# Altium integrated library shared_lib_1.IntLib: 112 symbols
Pins are listed as number, name and electrical type; pins without a type are passive.

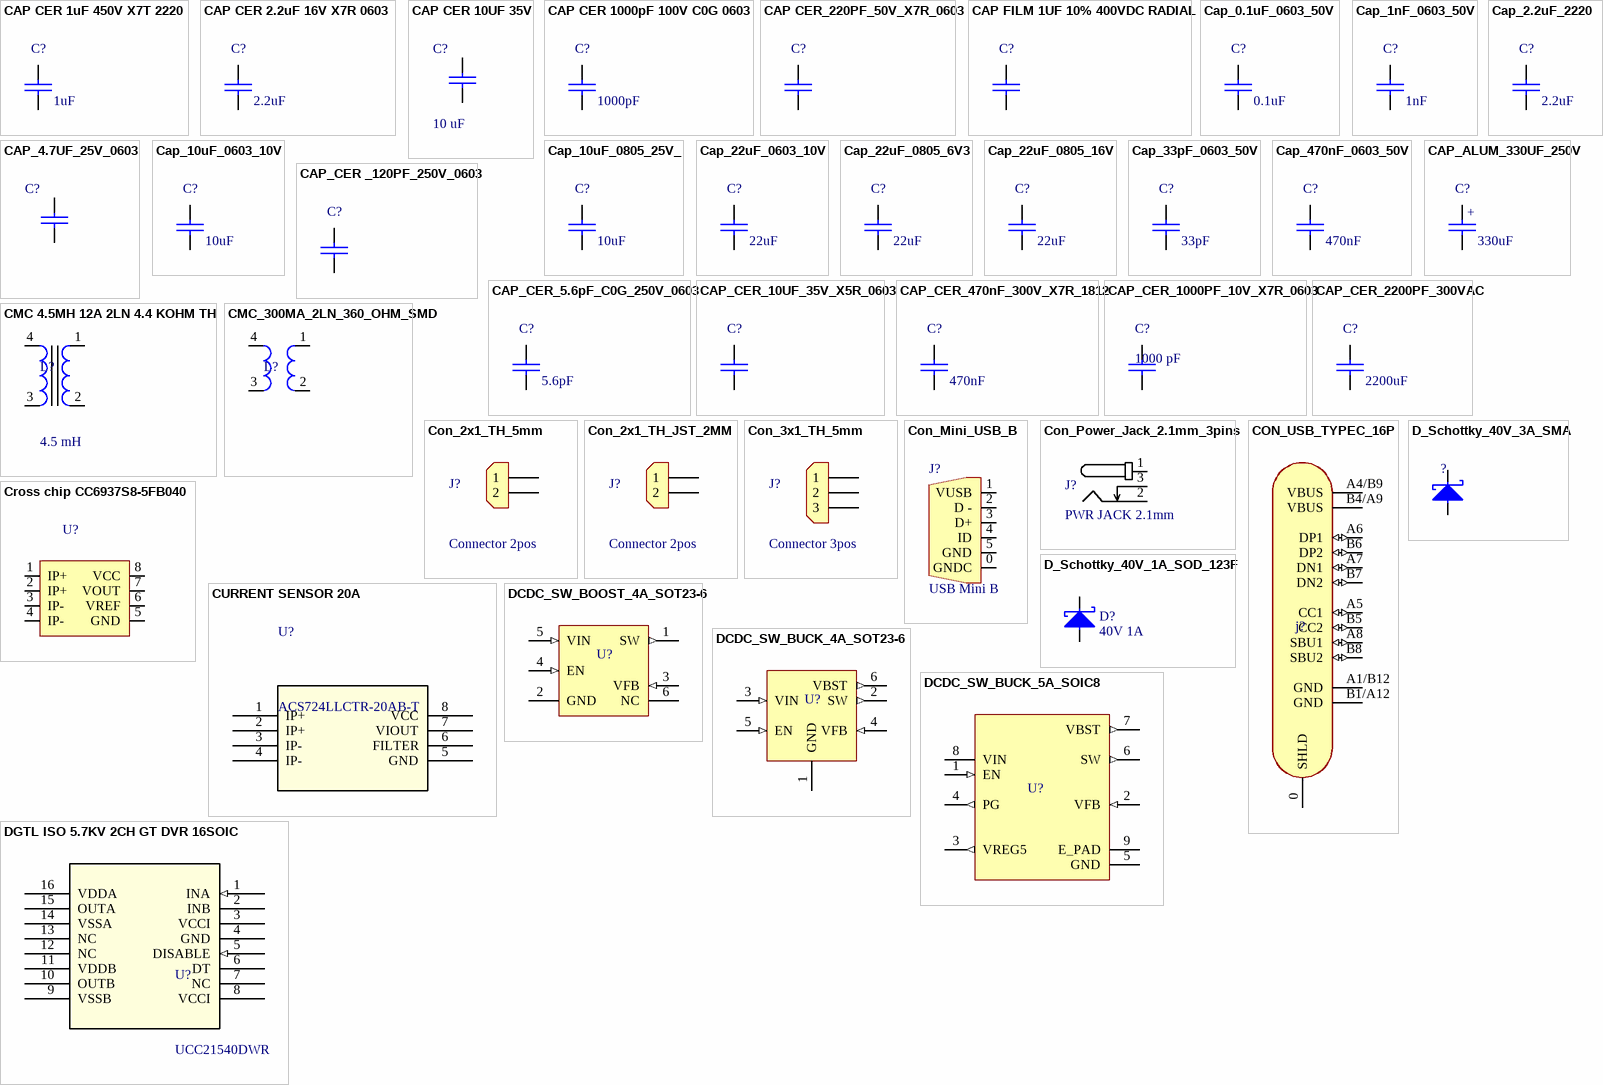
[diagram p0: symbols CAP CER 1uF 450V X7T 2220 to DGTL ISO 5.7KV 2CH GT DVR 16SOIC]

## CAP CER 1uF 450V X7T 2220
designator C?, comment value 1uF  (hidden comment: 1uF 50V)
CAP CER 1uF 450V X7T 2220; Manufacturer: muRata; Manufacturer Part Number: GC355XD7LP105KX17L; Supplier 1: LCSC; Supplier Part Number 1: C5119323; ComponentLink1Description: LCSC; ComponentLink1URL: https://www.lcsc.com/product-detail/C5119323.html?s_z=n_q_t_ceramic%2520capacitor&spm=wm.fly.bg.0.xh___wm.ssy.tc.0.tz&lcsc_vid=Q1QLUFRRTgRfUVdSQAVWUgVQT1JdUlwFE1MMV1EEQgAxVlNRTlhcUlRSQVJdUzsOAxUeFF5JWBYZEEoKFBINSQcJGk4dAgUUFAk%3D
footprint CAP_2220
pins: 1, 2

## CAP CER 2.2uF 16V X7R 0603
designator C?, comment value 2.2uF  (hidden comment: 2.2uF 16V)
CAP CER 2.2uF 16V X7R 0603; Manufacturer: Taiyo Yuden; Manufacturer Part Number: EMK107BB7225KA-T; Supplier 1: LCSC; Supplier Part Number 1: C337443; ComponentLink1Description: LCSC; ComponentLink1URL: https://www.lcsc.com/product-detail/C337443.html?s_z=n_q_EMK107BB7225KA-T&spm=wm.fly.bg.0.xh&lcsc_vid=FQVeX1BfQFIKVFVWE1NbBlcHQlcKVgFUQwMPAQZWElcxVlNRTlheVFNUQFFcXzsOAxUeFF5JWBYZEEoKFBINSQcJGk4eFQsCAgIaSgADAwAHC0slRldcVVFRWQkaCgg%3D
footprint 0603_cap
pins: 1, 2

## CAP CER 10UF 35V
designator C?, comment 10 uF
CAP CER 10UF 35V X5R 0603; Manufacturer: Murata Electronics; Manufacturer Part Number: GRM188R6YA106MA73J; ComponentLink1Description: LCSC; ComponentLink1URL: https://www.lcsc.com/product-detail/C2244191.html?s_z=n_q_GRM188R6YA106MA73J&spm=wm.fly.bg.0.xh&lcsc_vid=RQNdVwAEE1JbUldTTgAIXlFWQ1NYXlYETgNXUlBVFQMxVlNRTlReVF1VQ1JXXjsOAxUeFF5JWBYZEEoKFBINSQcJGk4eFQsCAgIaSgADAwAHC0slRVBWVFZVR08GEwkK; Supplier 1: LCSC; Supplier Part Number 1: C2244191
footprint 0603_cap
pins: 1, 2

## CAP CER 1000pF 100V C0G 0603
designator C?, comment 1000pF
CAP CER 1nF 100V C0G 0603; Manufacturer: muRata; Manufacturer Part Number: GRM1885C2A102JA01D; Supplier 1: LCSC; Supplier Part Number 1: C162257; ComponentLink1Description: LCSC; ComponentLink1URL: https://www.lcsc.com/product-detail/C162257.html?s_z=n_q_GRM1885C2A102JA01D&spm=wm.fly.bg.0.xh&lcsc_vid=FQVeX1BfQFIKVFVWE1NbBlcHQlcKVgFUQwMPAQZWElcxVlNRTlheVFZSTlJfXjsOAxUeFF5JWBYZEEoKFBINSQcJGk4%3D; Value: 1000pF
footprint 0603_cap
pins: 1, 2

## CAP CER_220PF_50V_X7R_0603
designator C?, comment 220 pF  (value not drawn)
CAP CER 220pF 50V X7R 0603; Manufacturer: Samsung Electro-Mechanics; Manufacturer Part Number: CL10B221KB8NNNC; Supplier 1: LCSC; Supplier Part Number 1: C1603; ComponentLink1Description: LCSC; ComponentLink1URL: https://www.lcsc.com/product-detail/C1603.html?spm=wm.fly.bg.0.xh&lcsc_vid=Q1QLUFRRTgRfUVdSQAVWUgVQT1JdUlwFE1MMV1EEQgAxVlNRTlhfUFFeRFBfXjsOAxUeFF5JWBYZEEoKFBINSQcJGk4NBhADEA4cHktXRlVcSQwSGg0%3D
footprint 0603_cap
pins: 1, 2

## CAP FILM 1UF 10% 400VDC RADIAL
designator C?, comment 1 uF  (value not drawn)
1 µF Film Capacitor 200V 400V Polyester, Polyethylene Terephthalate (PET), Metallized Radial; Manufacturer: KEMET; Manufacturer Part Number: R60MN4100AA40K; Supplier 1: LCSC; Supplier Part Number 1: C3775208; ComponentLink1Description: LCSC; ComponentLink1URL: https://www.lcsc.com/product-detail/C3775208.html?s_z=n_q_R60MN4100AA40K&spm=wm.fly.bg.0.xh&lcsc_vid=Q1QLUFRRTgRfUVdSQAVWUgVQT1JdUlwFE1MMV1EEQgAxVlNRTlZbUlJXT1VWXjsOAxUeFF5JWBYZEEoKFBINSQcJGk4eFQsCAgIaSgADAwAHC0slRVhXUFVQR08GEwkK
footprint CAP_M26.5X8.5_22.5_1_KEM
pins: 1, 2

## Cap_0.1uF_0603_50V
designator C?, comment 0.1uF
CAP CER 100nF 50V Y5V 0603; Manufacturer: FOJAN; Manufacturer Part Number: FCC0603F104Z500CT; Supplier 1: LCSC; Supplier Part Number 1: C5137469; ComponentLink1Description: LCSC; ComponentLink1URL: https://www.lcsc.com/product-detail/C5137469.html?s_z=n_q_0603F104Z500CT&spm=wm.fly.bg.2.xh&lcsc_vid=Q1QLUFRRTgRfUVdSQAVWUgVQT1JdUlwFE1MMV1EEQgAxVlNRTlhfUFBXRlRXUTsOAxUeFF5JWBYZEEoKFBINSQcJGk4eFQsCAgIaSgADAwAHC0slTldfUldfWQkaCgg%3D; Value: 0.1uF
footprint 0603_cap
pins: 1, 2

## Cap_1nF_0603_50V
designator C?, comment value 1nF  (hidden comment: 1nF 50V)
50V 1nF X7R ±10% 0603 Multilayer Ceramic Capacitors MLCC - SMD/SMT ROHS; Manufacturer: YAGEO; Manufacturer Part Number: CC0603KRX7R9BB102; Supplier 1: LCSC; Supplier Part Number 1: C100040; ComponentLink1Description: LCSC; ComponentLink1URL: https://www.lcsc.com/product-detail/Multilayer-Ceramic-Capacitors-MLCC-SMD-SMT_YAGEO-CC0603KRX7R9BB102_C100040.html
footprint 0603_cap
pins: 1, 2

## Cap_2.2uF_2220
designator C?, comment value 2.2uF  (hidden comment: 2.2uF 250V)
CAP CER 2.2uF 250V X7R 2220; Manufacturer: CCTC; Manufacturer Part Number: 2220B225K251CT; Supplier 1: LCSC; Supplier Part Number 1: C3845592; ComponentLink1Description: LCSC; ComponentLink1URL: https://www.lcsc.com/product-detail/Multilayer-Ceramic-Capacitors-MLCC-SMD-SMT_CCTC-TCC0603X5R106K100CT_C380314.html
footprint CAP_2220
pins: 1, 2

## CAP_4.7UF_25V_0603
designator C?
CAP CER 4.7uF 25V X5R 0603; Manufacturer: muRata; Manufacturer Part Number: GRM188R61E475KE11D; ComponentLink1Description: LCSC; ComponentLink1URL: https://www.lcsc.com/product-detail/C90057.html?s_z=n_q_GRM188R61E475KE11D&spm=wm.fly.bg.0.stp&lcsc_vid=RQNdVwAEE1JbUldTTgAIXlFWQ1NYXlYETgNXUlBVFQMxVlNRTlVXX11TRlZZXjsOAxUeFF5JWBYZEEoKFBINSQcJGk4%3D; Supplier 1: LCSC; Supplier Part Number 1: C90057
footprint 0603_cap
pins: 1, 2

## Cap_10uF_0603_10V
designator C?, comment value 10uF  (hidden comment: 10uF 10V)
10V 10uF X5R ±10% 0603 Multilayer Ceramic Capacitors MLCC - SMD/SMT ROHS; Manufacturer: CCTC; Manufacturer Part Number: TCC0603X5R106K100CT; Supplier 1: LCSC; Supplier Part Number 1: C380314; ComponentLink1Description: LCSC; ComponentLink1URL: https://www.lcsc.com/product-detail/Multilayer-Ceramic-Capacitors-MLCC-SMD-SMT_CCTC-TCC0603X5R106K100CT_C380314.html
footprint 0603_cap
pins: 1, 2

## Cap_10uF_0805_25V_
designator C?, comment value 10uF  (hidden comment: 10uF 25V)
25V 10uF X5R ±10% 0805 Multilayer Ceramic Capacitors MLCC - SMD/SMT ROHS; Manufacturer: Samsung Electro-Mechanics; Manufacturer Part Number: CL21A106KAYNNNE; Supplier 1: LCSC; Supplier Part Number 1: C15850; ComponentLink1Description: LCSC; ComponentLink1URL: https://lcsc.com/product-detail/Multilayer-Ceramic-Capacitors-MLCC-SMD-SMT_Samsung-Electro-Mechanics-CL21A106KAYNNNE_C15850.html
footprint 0805_cap
pins: 1, 2

## Cap_22uF_0603_10V
designator C?, comment value 22uF  (hidden comment: 22uF 10V)
10V 22uF X5R ±20% 0603 Multilayer Ceramic Capacitors MLCC - SMD/SMT ROHS; Manufacturer: HRE; Manufacturer Part Number: CGA0603X5R226M100JT; Supplier 1: LCSC; Supplier Part Number 1: C6119863; ComponentLink1Description: LCSC; ComponentLink1URL: https://lcsc.com/product-detail/Multilayer-Ceramic-Capacitors-MLCC-SMD-SMT_HRE-CGA0603X5R226M100JT_C6119863.html
footprint 0603_cap
pins: 1, 2

## Cap_22uF_0805_6V3
designator C?, comment value 22uF  (hidden comment: 22uF 6V3)
6.3V 22uF X5R ±20% 0805 Multilayer Ceramic Capacitors MLCC - SMD/SMT ROHS; Manufacturer: Samsung Electro-Mechanics; Manufacturer Part Number: CL21A226MQQNNNE; Supplier 1: LCSC; Supplier Part Number 1: C5674; ComponentLink1Description: LCSC; ComponentLink1URL: https://www.lcsc.com/product-detail/Multilayer-Ceramic-Capacitors-MLCC-SMD-SMT_Samsung-Electro-Mechanics-CL21A226MQQNNNE_C5674.html
footprint 0805_cap
pins: 1, 2

## Cap_22uF_0805_16V
designator C?, comment value 22uF  (hidden comment: 22uF 16V)
16V 22uF X5R ±20% 0805 Multilayer Ceramic Capacitors MLCC - SMD/SMT ROHS; Manufacturer: Chinocera; Manufacturer Part Number: HGC0805R5226M160NSLJ; Supplier 1: LCSC; Supplier Part Number 1: C33546008; ComponentLink1Description: LCSC; ComponentLink1URL: https://lcsc.com/product-detail/Multilayer-Ceramic-Capacitors-MLCC-SMD-SMT_Chinocera-HGC0805R5226M160NSLJ_C33546008.html
footprint 0805_cap
pins: 1, 2

## Cap_33pF_0603_50V
designator C?, comment value 33pF  (hidden comment: 33pF 50V)
50V 33pF NP0 ±5% 0603 Multilayer Ceramic Capacitors MLCC - SMD/SMT ROHS; Manufacturer: YAGEO; Manufacturer Part Number: CC0603JRNPO9BN330; Supplier 1: LCSC; Supplier Part Number 1: C107047; ComponentLink1Description: LCSC; ComponentLink1URL: https://www.lcsc.com/product-detail/Multilayer-Ceramic-Capacitors-MLCC-SMD-SMT_YAGEO-CC0603JRNPO9BN330_C107047.html
footprint 0603_cap
pins: 1, 2

## Cap_470nF_0603_50V
designator C?, comment value 470nF  (hidden comment: 470nF 50V)
50V 470nF X7R ±10% 0603 Multilayer Ceramic Capacitors MLCC - SMD/SMT ROHS; Manufacturer: Chinocera; Manufacturer Part Number: HGC0603R7474K500NTHJ; Supplier 1: LCSC; Supplier Part Number 1: C33546006; ComponentLink1Description: LCSC; ComponentLink1URL: https://lcsc.com/product-detail/Multilayer-Ceramic-Capacitors-MLCC-SMD-SMT_Chinocera-HGC0603R7474K500NTHJ_C33546006.html
footprint 0603_cap
pins: 1, 2

## CAP_ALUM_330UF_250V
designator C?, comment value 330uF  (hidden comment: 330 uF)
330 µF 250 V Aluminum Electrolytic Capacitors Radial, Can - Snap-In 3000 Hrs @ 105°C; Manufacturer: Rubycon; Manufacturer Part Number: 250MXG330MEFCSN22X30; Supplier 1: LCSC; Supplier Part Number 1: C239294; ComponentLink1Description: LCSC; ComponentLink1URL: https://www.lcsc.com/product-detail/C239294.html?s_z=n_q_250MXG330MEFCSN22X30
footprint CAP_MXC_22x30_RUB
pins: 1, 2
text: +

## CAP_CER _120PF_250V_0603
designator C?, comment 120 pF  (value not drawn)
120 pF ±5% 250V Capacitores cerámicos C0G, NP0 0603 (1608 métrico); Manufacturer: YAGEO; Manufacturer Part Number: CL10B102KB8NNNC; Supplier 1: LCSC; Supplier Part Number 1: C3852667; ComponentLink1Description: LCSC; ComponentLink1URL: https://www.lcsc.com/product-detail/C3852667.html?s_z=n_q_CC0603JRNPOYBN121&spm=wm.fly.bg.0.xh&lcsc_vid=Q1QLUFRRTgRfUVdSQAVWUgVQT1JdUlwFE1MMV1EEQgAxVlNRTldaUVdSRlBeXjsOAxUeFF5JWBYZEEoKFBINSQcJGk4dAgUUFAk%3D
footprint 0603_cap
pins: 1, 2

## CAP_CER_5.6pF_C0G_250V_0603
designator C?, comment value 5.6pF  (hidden comment: 2.2uF)
5.6pF C0G 250V 0603 Ceramic Capacitors RoHS; Manufacturer: Taiyo Yuden; Manufacturer Part Number: VJ0603D5R6CXPAJ; Supplier 1: LCSC; Supplier Part Number 1: C2241545; ComponentLink1Description: LCSC; ComponentLink1URL: https://www.lcsc.com/product-detail/C337443.html?s_z=n_q_EMK107BB7225KA-T&spm=wm.fly.bg.0.xh&lcsc_vid=FQVeX1BfQFIKVFVWE1NbBlcHQlcKVgFUQwMPAQZWElcxVlNRTlheVFNUQFFcXzsOAxUeFF5JWBYZEEoKFBINSQcJGk4eFQsCAgIaSgADAwAHC0slRldcVVFRWQkaCgg%3D
footprint 0603_cap
pins: 1, 2

## CAP_CER_10UF_35V_X5R_0603
designator C?, comment 10 uF  (value not drawn)
10 µF ±20% 35V Capacitores cerámicos X5R 0603 (1608 métrico); Manufacturer: Murata Electronics; Manufacturer Part Number: GRM188R6YA106MA73D; Supplier 1: DigiKey; Supplier Part Number 1: 490-13248-1-ND; ComponentLink1Description: DigiKey; ComponentLink1URL: https://www.digikey.com/es/products/detail/murata-electronics/GRM188R6YA106MA73D/5877411
footprint 0603_cap
pins: 1, 2

## CAP_CER_470nF_300V_X7R_1812
designator C?, comment 470nF
CAP CER470nF 300V X7R 1812; Manufacturer: TDK; Manufacturer Part Number: C1812X474K301TG; Supplier 1: LCSC; Supplier Part Number 1: C961539; ComponentLink1Description: LCSC; ComponentLink1URL: https://www.lcsc.com/product-detail/C342865.html?s_z=s_c_Ceramic%2520Capacitors&spm=wm.fly.bg.0.xh&lcsc_vid=Q1QLUFRRTgRfUVdSQAVWUgVQT1JdUlwFE1MMV1EEQgAxVlNRTlhfUl1TT1ZcUDsOAxUeFF5JWBYZEEoKFBINSQcJGk4dAgUUFAk%3D; Value: 470nF
footprint 1812_CAP
pins: 1, 2

## CAP_CER_1000PF_10V_X7R_0603
designator C?, comment 1000 pF
1000 pF ±10% 10V Ceramic Capacitor X7R 0603 (1608 Metric); Manufacturer: Johanson Technology Inc.; Manufacturer Part Number: C0603C102K5RACTU; Supplier 1: LCSC; Supplier Part Number 1: C2167129; ComponentLink1Description: LCSC; ComponentLink1URL: https://www.lcsc.com/product-detail/C2167129.html?s_z=n_q_p_C0603C102K8RACTU&spm=wm.ssy.bg.0.xh&lcsc_vid=FQVeX1BfQFIKVFVWE1NbBlcHQlcKVgFUQwMPAQZWElcxVlNRTllaV1NURlFaVzsOAxUeFF5JWBYZEEoKFBINSQcJGk4eFQsCAgIaSgADAwAHC0slRlBaUVJRWQkaCgg%3D
footprint 0603_cap
pins: 1, 2

## CAP_CER_2200PF_300VAC
designator C?, comment 2200uF
2200 pF ±20% 300VAC Ceramic Capacitor E Radial, Disc; Manufacturer: Murata Electronics; Manufacturer Part Number: DE6E3KJ222MN3A; Supplier 1: LCSC; Supplier Part Number 1: C710554; ComponentLink1Description: LCSC; ComponentLink1URL: https://www.lcsc.com/product-detail/C710554.html?s_z=n_q_DE6E3KJ222MN3A&spm=wm.fly.bg.0.xh&lcsc_vid=FQVeX1BfQFIKVFVWE1NbBlcHQlcKVgFUQwMPAQZWElcxVlNRTlheV1JTQ1JYVzsOAxUeFF5JWBYZEEoKFBINSQcJGk4eFQsCAgIaSgADAwAHC0slRVBYUFVUTk8GEwkK; Value: 2200uF
footprint Through Hole,P=7.5mm
pins: 1, 2

## CMC 4.5MH 12A 2LN 4.4 KOHM TH
designator L?, comment 4.5 mH
4.5 mH @ 4 MHz 2 Line Common Mode Choke Through Hole 4.4 kOhms @ 4 MHz 12A DCR 8.5mOhm; Manufacturer: WurthPULSE Elektronik; Manufacturer Part Number: PH9455.405NL; ComponentLink1Description: JLCPCB; ComponentLink1URL: https://www.lcsc.com/product-detail/C5718402.html; Supplier 1: JLCPCB; Supplier Part Number 1: C5718402
footprint PH9455405NL
pins: 1, 2, 3, 4

## CMC_300MA_2LN_360_OHM_SMD
designator L?
2 Obturador de modo común de línea Montaje en superficie 360 Ohms @ 100 MHz 300mA DCR 500mOhm; Manufacturer: Bourns Inc.; Manufacturer Part Number: SRF2012-361YA; ComponentLink1Description: DigiKEy; ComponentLink1URL: https://www.digikey.com/es/products/detail/bourns-inc/SRF2012-361YA/2681268?s=N4IgTCBcDaIMoCUBiYAMBGMBaAzANnQE0BBEAXQF8g; Supplier 1: DigiKey; Supplier Part Number 1: SRF2012-361YACT-ND
footprint SRF2012-361YA
pins: 1, 2, 3, 4

## Con_2x1_TH_5mm
designator J?, comment Connector 2pos
2POS 5MM; Manufacturer: JILN; Manufacturer Part Number: JL126-50002G01; Supplier 1: LCSC; Supplier Part Number 1: C394556; ComponentLink1Description: Digi-Key; ComponentLink1URL: https://www.lcsc.com/product-detail/Screw-terminal_JILN-JL126-50002G01_C394556.html
footprint CON_2x1_TH_5MM
pins: 1, 2

## Con_2x1_TH_JST_2MM
designator J?, comment Connector 2pos
2POS 2MM; Manufacturer: JST; Manufacturer Part Number: S2B-PH-K-S(LF)(SN); Supplier 1: LCSC; Supplier Part Number 1: C173752; ComponentLink1Description: Digi-Key; ComponentLink1URL: https://lcsc.com/product-detail/Wire-To-Board-Connector_JST-S2B-PH-K-S-LF-SN_C173752.html
footprint CON_2x1_TH_2MM (/20190307/N-A.Potosi)
pins: 1, 2

## Con_3x1_TH_5mm
designator J?, comment Connector 3pos
1x3P 10A -40℃~+105℃ 300V Green 14~26 Through Hole 5mm 2.5 1 3 Plugin,P=5mm Screw Terminal Blocks ROHS; Manufacturer: MAX; Manufacturer Part Number: MX126-5.0-03P-GN01-Cu-S-A; Supplier 1: LCSC; Supplier Part Number 1: C5188435; ComponentLink1Description: Digi-Key; ComponentLink1URL: https://lcsc.com/product-detail/Screw-Terminal-Blocks_MAX-MX126-5-0-03P-GN01-Cu-S-A_C5188435.html
footprint CON_3x1_TH_5mm
pins: 1, 2, 3

## Con_Mini_USB_B
designator J?, comment USB Mini B
CONN RCPT USB2.0 MINI B SMD R/A; Manufacturer Part Number: KH-MINI-SMT-5P-Cu; Manufacturer: EDAC Inc.; ComponentLink1Description: LCSC; ComponentLink1URL: https://datasheet.lcsc.com/lcsc/2106070035_Shenzhen-Kinghelm-Elec-KH-MINI-SMT-5P-Cu_C2688795.pdf; Supplier 1: LCSC; Supplier Part Number 1: C2688795
footprint CON_5x1_SMD_miniUSB_B (20190328 / V-A.Patino)
pins: 0 GNDC, 1 VUSB, 2 D -, 3 D+, 4 ID, 5 GND

## Con_Power_Jack_2.1mm_3pins
designator J?, comment PWR JACK 2.1mm
CONN PWR JACK 2X5.5MM SOLDER; Manufacturer: HCTL; Manufacturer Part Number: HC-DC-005-2.0T; Supplier 1: LCSC; Supplier Part Number 1: C3010533; ComponentLink1Description: LCSC; ComponentLink1URL: https://www.lcsc.com/product-detail/AC-DC-Power-Connectors_HCTL-HC-DC-005-2-0T_C3010533.html
footprint CON_POWER_BARREL_2.1MM_3CONN (/ 20190222 / C-A.Serna.A)
pins: 1, 2, 3

## CON_USB_TYPEC_16P
designator j?, comment USB C  (value not drawn)
3A USB 3.1 1 Surface Mount 16P Female -40℃~+85℃ Type-C SMD USB Connectors ROHS; Manufacturer: SHOU HAN; Manufacturer Part Number: TYPE-C-3.1-16PIN; Supplier 1: LCSC; Supplier Part Number 1: C7507405; ComponentLink1Description: LCSC; ComponentLink1URL: https://lcsc.com/product-detail/USB-Connectors_SHOU-HAN-TYPE-C-3-1-16PIN_C7507405.html
footprint CON_USB_C_16P_RA
pins: 0 SHLD, A1/B12 GND (power), A4/B9 VBUS (power), A5 CC1 (io), A6 DP1 (io), A7 DN1 (io), A8 SBU1 (io), B1/A12 GND (power), B4/A9 VBUS (power), B5 CC2 (io), B6 DP2 (io), B7 DN2 (io), B8 SBU2 (io)

## Cross chip CC6937S8-5FB040
designator U?
High-performance Hall effect current sensor; Manufacturer: Cross chip; Manufacturer Part Number: CC6937S8-5FB040; Supplier 1: LCSC; Supplier Part Number 1: C41421928; ComponentLink1Description: LCSC; ComponentLink1URL: https://www.lcsc.com/product-detail/C41421928.html?s_z=n_q_CC6937S8-5FB040&spm=wm.fly.bg.0.xh&lcsc_vid=Q1QLUFRRTgRfUVdSQAVWUgVQT1JdUlwFE1MMV1EEQgAxVlNRTldbV1ZWRVhcVTsOAxUeFF5JWBYZEEoKFBINSQcJGk4eFQsCAgIaSgADAwAHC0slRVlYVFZWTk8GEwkK
footprint SOP-8_L4.9
pins: 1 IP+, 2 IP+, 3 IP-, 4 IP-, 5 GND, 6 VREF, 7 VOUT, 8 VCC

## CURRENT SENSOR 20A
designator U?, comment ACS724LLCTR-20AB-T
Sensores de corriente ±20 A 1 canal Efecto Hall, Circuito abierto Bidireccional 8-SOIC (0.154", 3.90mm de ancho); Manufacturer: Allegro MicroSystems; ComponentLink1Description: LCSC; ComponentLink1URL: https://www.lcsc.com/product-detail/Current-Sensors_Allegro-MicroSystems-LLC-ACS724LLCTR-20AB-T_C99738.html; Supplier 1: LCSC; Manufacturer Part Number: ACS724LLCTR-20AB-T; Supplier Part Number 1: C99738
footprint SOICN8_LC_ALM
pins: 1 IP+, 2 IP+, 3 IP-, 4 IP-, 5 GND (power), 6 FILTER, 7 VIOUT, 8 VCC (power)

## D_Schottky_40V_1A_SOD_123F
designator D?, comment 40V 1A
DIODE SCHOTTKY 40V 1A SOD123F; Manufacturer: Shanghai Prisemi Elec; Manufacturer Part Number: PSBD1DF40V1H; Supplier 1: LCSC; Supplier Part Number 1: C110730; ComponentLink1Description: LCSC; ComponentLink1URL: https://www.lcsc.com/product-detail/Switching-Diode_Shanghai-Prisemi-Elec-PSBD1DF40V1H_C110730.html
footprint SOD_123 (/ 20191030 / V-A.Patino)
pins: 1, 2

## D_Schottky_40V_3A_SMA
designator ?, comment 30V 3A  (value not drawn)
40V Independent 3A 550mV@3A SMA Schottky Diodes ROHS; Manufacturer: TDSEMIC; Manufacturer Part Number: SS34-TD; Supplier 1: LCSC; Supplier Part Number 1: C46550832; ComponentLink1Description: LCSC; ComponentLink1URL: https://lcsc.com/product-detail/Schottky-Diodes_TDSEMIC-SS34-TD_C46550832.html
footprint SMA
pins: 1, 2

## DCDC_SW_BOOST_4A_SOT23-6
designator U?, comment TPS564201DDCR  (value not drawn)
IC REG BUCK ADJ 4A SOT23; Manufacturer: XI'AN Aerosemi Tech; Manufacturer Part Number: MT3608B; Supplier 1: LCSC; Supplier Part Number 1: C19189893; ComponentLink1Description: LCSC; ComponentLink1URL: https://lcsc.com/product-detail/DC-DC-Converters_XI-AN-Aerosemi-Tech-MT3608B_C19189893.html
footprint SOT_23_6 (/ 20190225 / V-A.Patino)
pins: 1 SW (out), 2 GND (power), 3 VFB (in), 4 EN (in), 5 VIN (in), 6 NC

## DCDC_SW_BUCK_4A_SOT23-6
designator U?, comment TPS564201DDCR  (value not drawn)
IC REG BUCK ADJ 4A SOT23; Manufacturer: Texas Instruments; Manufacturer Part Number: TPS564201DDCR; Supplier 1: LCSC; Supplier Part Number 1: C464812; ComponentLink1Description: LCSC; ComponentLink1URL: https://lcsc.com/product-detail/DC-DC-Converters_Texas-Instruments-TPS564201DDCR_C464812.html
footprint SOT_23_6 (/ 20190225 / V-A.Patino)
pins: 1 GND (power), 2 SW (out), 3 VIN (in), 4 VFB (in), 5 EN (in), 6 VBST (out)

## DCDC_SW_BUCK_5A_SOIC8
designator U?, comment TPS56528DDAR  (value not drawn)
IC REG BUCK ADJ 5A 8SOPWR; Manufacturer: Texas Instruments; Manufacturer Part Number: TPS56528DDAR; Supplier 1: LCSC; Supplier Part Number 1: C138716; ComponentLink1Description: LCSC; ComponentLink1URL: https://lcsc.com/product-detail/DC-DC-Converters_Texas-Instruments-TPS56528DDAR_C138716.html
footprint SOIC_8_3.9mm_EP
pins: 1 EN (in), 2 VFB (in), 3 VREG5 (out), 4 PG (out), 5 GND (power), 6 SW (out), 7 VBST (out), 8 VIN (power), 9 E_PAD (power)

## DGTL ISO 5.7KV 2CH GT DVR 16SOIC
designator U?, comment UCC21540DWR
4A, 6A Controladores de compuerta Acoplamiento capacitivo 5700Vrms 2 canal 16-SOIC; Manufacturer: Texas Instruments; ComponentLink1Description: LCSC; ComponentLink1URL: https://www.lcsc.com/product-detail/Isolators-Gate-Drivers_Texas-Instruments-UCC21540DWR_C544736.html; Supplier 1: LCSC; Supplier Part Number 1: C544736; Manufacturer Part Number: UCC21540DWR
footprint UCC21540DW
pins: 1 INA (in), 2 INB, 3 VCCI (power), 4 GND, 5 DISABLE (in), 6 DT, 7 NC, 8 VCCI (power), 9 VSSB (power), 10 OUTB, 11 VDDB, 12 NC, 13 NC (power), 14 VSSA (power), 15 OUTA, 16 VDDA

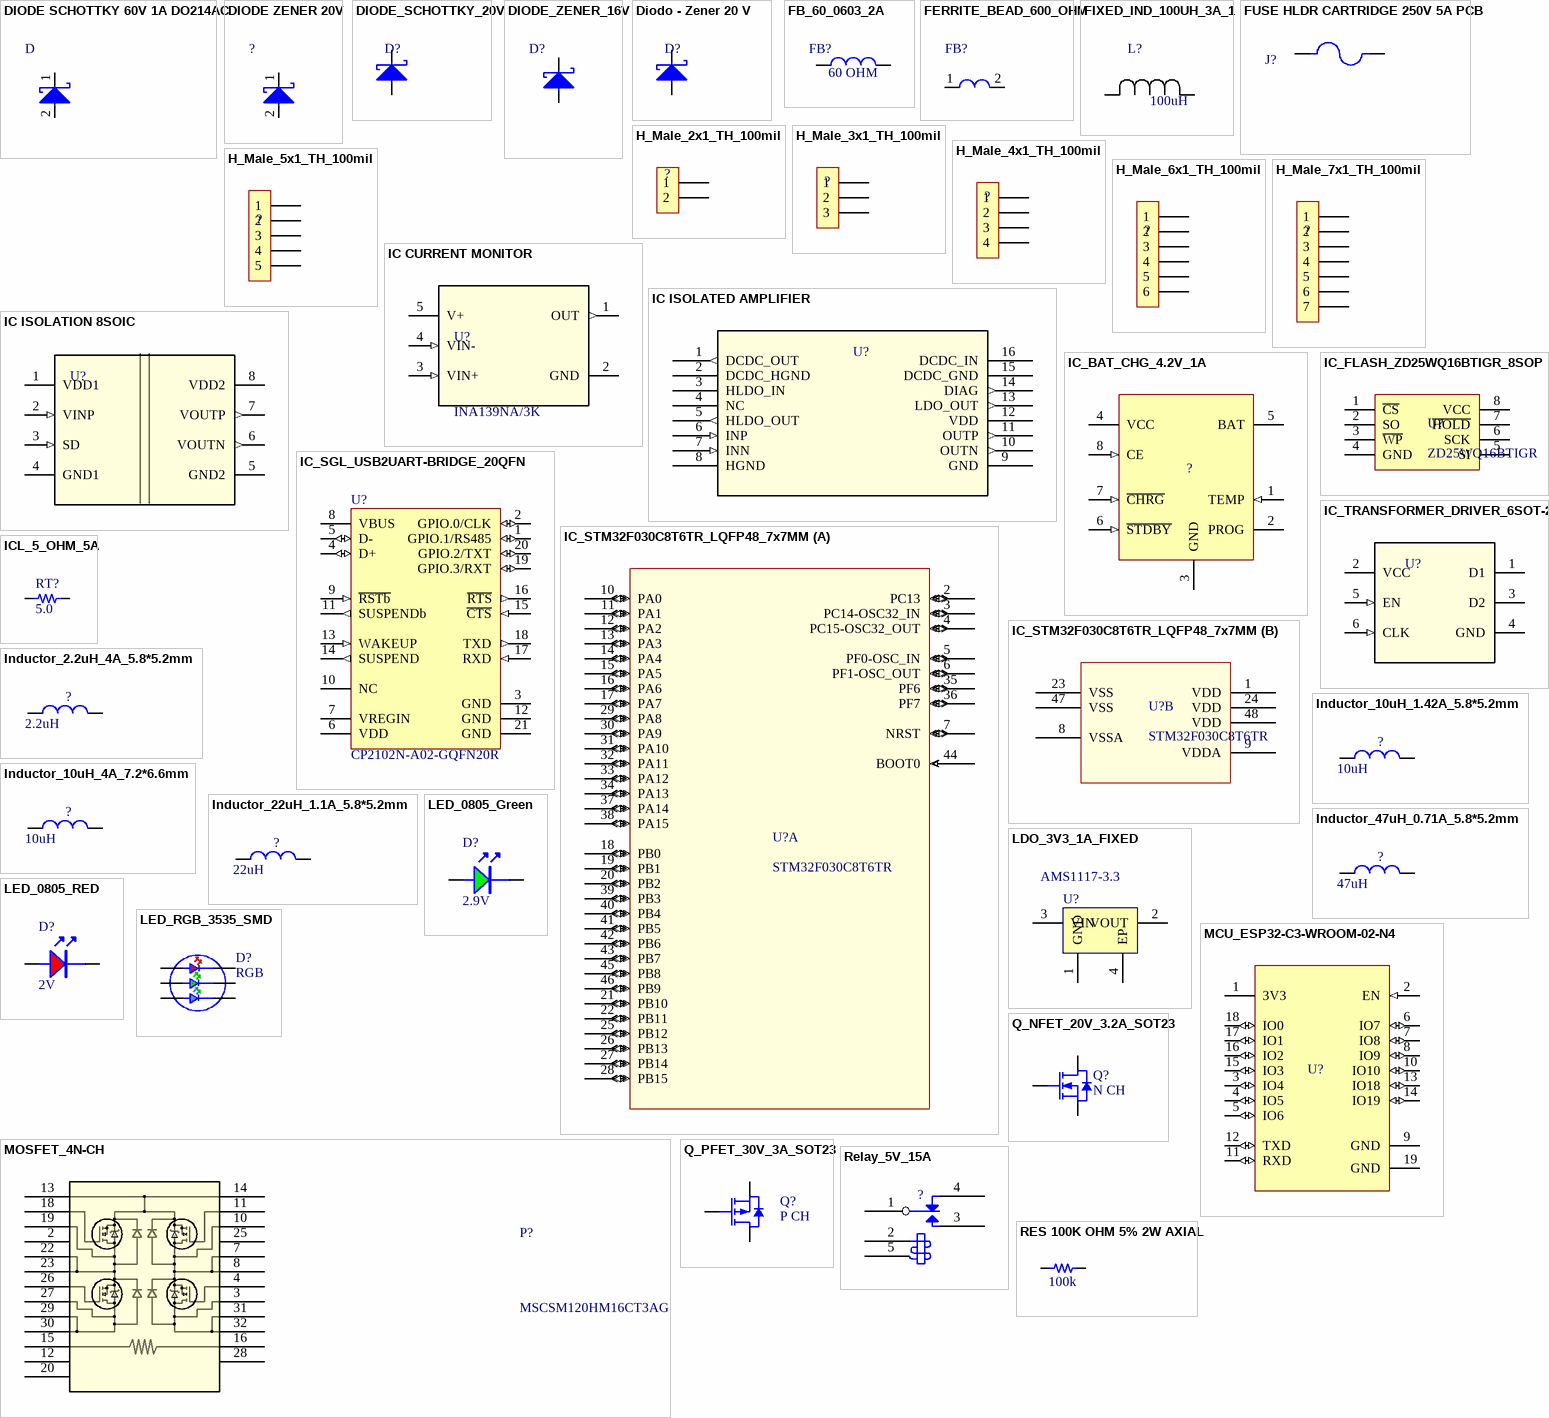
[diagram p1: symbols DIODE SCHOTTKY 60V 1A DO214AC to RES 100K OHM 5% 2W AXIAL]

## DIODE SCHOTTKY 60V 1A DO214AC
designator D
Diodos 60 V 1A Montaje en superficie DO-214AC (SMA); Manufacturer: Taiwan Semiconductor Corporation; Manufacturer Part Number: SS16; ComponentLink1Description: DigiKEy; ComponentLink1URL: https://www.digikey.com/es/products/detail/taiwan-semiconductor-corporation/SS16/7369359; Supplier 1: DigiKey; Supplier Part Number 1: 1801-SS16CT-ND
footprint SS16
pins: 1, 2

## DIODE ZENER 20V
designator ?, comment 20V  (value not drawn)
Diodos 60 V 1A Montaje en superficie DO-214AC (SMA); Manufacturer: Good-Ark Semiconductor; Manufacturer Part Number: MMSZ5250B; ComponentLink1Description: DigiKEy; ComponentLink1URL: https://www.digikey.com/es/products/detail/good-ark-semiconductor/MMSZ5250B/18667706; Supplier 1: DigiKey; Supplier Part Number 1: 4786-MMSZ5250BCT-ND
footprint SOD-123_ONS
pins: 1, 2

## DIODE_SCHOTTKY_20V
designator D?
DIODE SCHOTTKY 20V 500MA SOD123; Manufacturer: onsemi; Manufacturer Part Number: MBR0520LT1G; Supplier 1: DigiKey; Supplier Part Number 1: DigiKey; ComponentLink1Description: DigiKey; ComponentLink1URL: https://www.digikey.com/es/products/detail/onsemi/MBR0520LT1G/918574?s=N4IgTCBcDaILICEBKAGArGFAZAKgRgHEQBdAXyA
footprint SOD-123_ONS
pins: 1, 2

## DIODE_ZENER_16V
designator D?
DIODE ZENER 16V 500MW SOD123; Manufacturer: onsemi; Manufacturer Part Number: MMSZ4703T1G; ComponentLink1Description: DigiKEy; ComponentLink1URL: https://www.digikey.com/es/products/detail/bourns-inc/PAD002-T764113S/15297652?s=N4IgTCBcDaIAoEEAiAGFYC0AVA7ANgBYBGIgZgGUQBdAXyA; Supplier 1: DigiKey; Supplier Part Number 1: MMSZ4703T1GOSCT-ND
footprint SOD-123_ONS
pins: 1, 2

## Diodo - Zener 20 V
designator D?
-55℃~+150℃ 1 Independent 100nA@15V 19V~21V 20V 25Ω 500mW 600Ω SOD-123 Zener Diodes ROHS; Manufacturer: Slkor(SLKORMICRO Elec.); Manufacturer Part Number: MMSZ5250B; Supplier 1: JLCPCB; Supplier Part Number 1: C707177; ComponentLink1Description: JLCPCB; ComponentLink1URL: https://jlcpcb.com/partdetail/Slkor_SLKORMICRO_Elec-MMSZ5250B/C707177
footprint SOD-123_ONS
pins: 1, 2

## FB_60_0603_2A
designator FB?, comment value 60 OHM  (hidden comment: 60OHM 2A)
2A 1 100mΩ 60Ω@100MHz ±25% 0603 Ferrite Beads ROHS; Manufacturer: TAI-TECH; Manufacturer Part Number: HCB1608KF-600T20; ComponentLink1Description: LCSC; ComponentLink1URL: https://www.lcsc.com/product-detail/Ferrite-Beads_TAI-TECH-HCB1608KF-600T20_C369516.html; Supplier 1: LCSC; Supplier Part Number 1: C369516
footprint 0603_fb
pins: 1, 2

## FERRITE_BEAD_600_OHM
designator FB?
FERRITE BEAD 600 OHM 0603 4LN; Manufacturer: Bourns Inc.; Manufacturer Part Number: MH1608-601Y; ComponentLink1Description: DigiKEy; ComponentLink1URL: https://www.digikey.com/en/products/detail/bourns-inc/MH1608-601Y/2563317; Supplier 1: DigiKey; Supplier Part Number 1: MH1608-601YCT-ND
footprint MH1608
pins: 1, 2

## FIXED_IND_100UH_3A_1
designator L?, comment value 100uH  (hidden comment: 200uH)
200 µH Unshielded Drum Core, Wirewound Inductor 3 A 80mOhm Max Radial, Horizontal Cylinder (Open); Manufacturer: FANGCHENG; Manufacturer Part Number: FCH1365-101M; Supplier 1: LCSC; Supplier Part Number 1: C20415559; ComponentLink1Description: LCSC; ComponentLink1URL: https://www.lcsc.com/product-detail/C20415559.html?s_z=n_q_C20415559&globalKeyword=C20415559
footprint IND-SMD_L13.7-W12.8_FCH1365
pins: 1, 2

## FUSE HLDR CARTRIDGE 250V 5A PCB
designator J?
Fuse Holder 5 A 250V 1 Circuit Cartridge Through Hole; Manufacturer: Keystone; Manufacturer Part Number: 4628; Supplier 1: LCSC; Supplier Part Number 1: C3205254; ComponentLink1Description: LCSC; ComponentLink1URL: https://www.lcsc.com/product-detail/C3205254.html?s_z=n_q_x_Keystone%25204628&spm=wm.ssy.em.0.tz&lcsc_vid=Q1QLUFRRTgRfUVdSQAVWUgVQT1JdUlwFE1MMV1EEQgAxVlNRTlZbVlFQQVlcXzsOAxUeFF5JWBYZEEoKFBINSQcJGk4eFQsCAgIaSgADAwAHC0slQ1hXVFRQQU8GEwkK
footprint FUSE_4628
pins: 1, 2

## H_Male_2x1_TH_100mil
designator ?, comment 2x1  (value not drawn)  (no BOM)
H_Male_2x1_TH_100mil; ComponentLink1Description: LCSC
footprint H_2x1_TH_100mil
pins: 1, 2

## H_Male_3x1_TH_100mil
designator ?, comment 3x1  (value not drawn)  (no BOM)
H_Male_3x1_TH_100mil; ComponentLink1Description: LCSC
footprint H_3X1_TH_100mil
pins: 1, 2, 3
